# Altium footprint library 通讯接口.PcbLib: 24 footprints (part 2 of 2)
Each footprint in its own frame and in the unit in brackets; x right, y up, seen from the top. Pads: shape width x height; smd on the part's side, far side on the other; paste and mask are expansions set on the pad; w line width, h text height; cw(c..) or ccw(c..) is an arc to the next point about the centre after c.
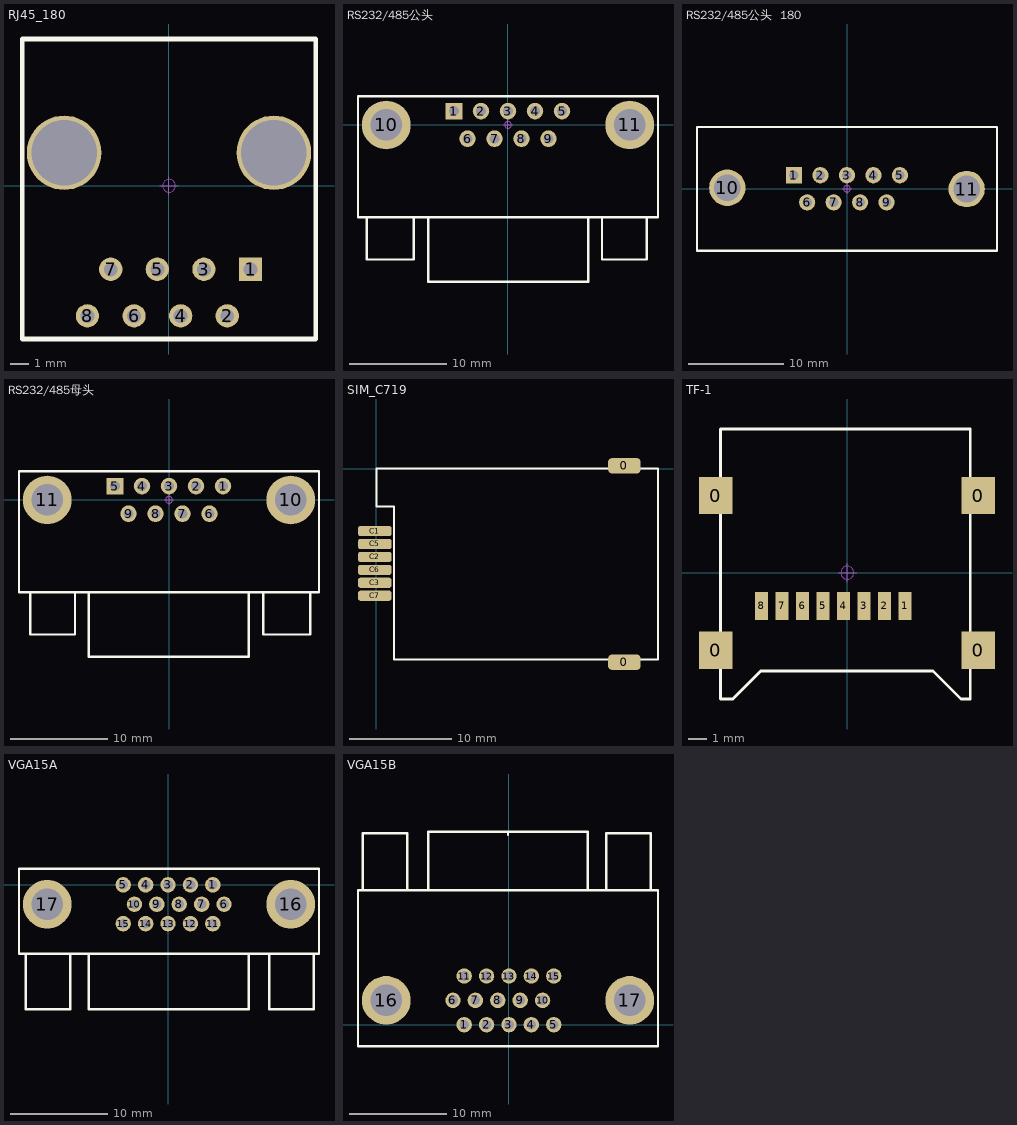
[diagram p1: the footprints below, top view; thin cyan lines are the x and y axes]

## RJ45_180 [mil] "网线接口"
height 53.15
pads (10):
  rect 50x50 hole 30: 1(175,-179.13)
  round 50 hole 30: 2(125,-279.13) 3(75,-179.13) 4(25,-279.13) 5(-25,-179.13) 6(-75,-279.13) 7(-125,-179.13) 8(-175,-279.13)
  round 160 hole 140: ""(-225,70.87) ""(225,70.87)
Top Overlay:
  lines w10: -314.96,-328.74 314.96,-328.74 314.96,314.96 -314.96,314.96 -314.96,-328.74
Mechanical 15:
  circle w1.97: c0,0 r13.78
  lines w1.97: -19.68,0 19.68,0 ; 0,-19.68 0,19.68
3D body "RJ-45, 8P8C, MOD JACK, TOP ENTRY, CAT 5E, RIA AJT26A8813.STEP": height 641.73, standoff -129.92, extent -305.11,-314.96 305.12,307.09

## RS232/485公头 [mm]
pads (11):
  rect 1.7x1.7 hole 1: 1(-5.546,1.42)
  round 1.7 hole 1: 2(-2.773,1.42) 3(0,1.42) 4(2.773,1.42) 5(5.546,1.42) 6(-4.155,-1.42) 7(-1.385,-1.42) 8(1.385,-1.42) 9(4.155,-1.42)
  round 5 hole 3.25: 10(-12.5,0) 11(12.5,0)
Top Overlay:
  lines w0.254: -14.478,-9.502 -14.478,-13.82 -9.652,-13.82 -9.652,-9.502 ; -8.175,-9.502 -8.175,-16.106 8.225,-16.106 8.225,-9.502 ; 9.652,-9.502 9.652,-13.82 14.224,-13.82 14.224,-9.502 ; -15.4,-9.502 15.4,-9.502 15.4,2.944 -15.4,2.944 -15.4,-9.502
Mechanical 15:
  circle w0.05: c0,0 r0.35
  lines w0.05: -0.5,0 0.5,0 ; 0,-0.5 0,0.5
3D body "DB9 ĸ_A.STEP": height 12.65, standoff -3.16, extent -15.45,-15.827 15.45,2.673

## RS232/485公头  180 [mm]
pads (11):
  rect 1.7x1.7 hole 1: 1(-5.556,1.42)
  round 1.7 hole 1: 2(-2.783,1.42) 3(-0.01,1.42) 4(2.763,1.42) 5(5.536,1.42) 6(-4.166,-1.42) 7(-1.396,-1.42) 8(1.374,-1.42) 9(4.144,-1.42)
  round 3.81 hole 2.794: 10(-12.522,0.104) 11(12.522,-0.023)
Top Overlay:
  lines w0.203: -15.697,-6.5 -15.697,6.454 15.697,6.454
  lines w0.254: -15.697,-6.5 15.697,-6.5 15.697,6.454
Mechanical 15:
  circle w0.05: c0,0 r0.35
  lines w0.05: -0.5,0 0.5,0 ; 0,-0.5 0,0.5
3D body "User Library-DB9-PCB Solder-male.STEP": height 12.17, standoff -4.73, extent -15.499,-6.2 15.499,6.2

## RS232/485母头 [mm]
pads (11):
  round 1.7 hole 1: 1(5.546,1.42) 2(2.773,1.42) 3(0,1.42) 4(-2.773,1.42) 6(4.155,-1.42) 7(1.385,-1.42) 8(-1.385,-1.42) 9(-4.155,-1.42)
  rect 1.7x1.7 hole 1: 5(-5.546,1.42)
  round 5 hole 3.25: 10(12.5,0) 11(-12.5,0)
Top Overlay:
  lines w0.254: -14.224,-9.502 -14.224,-13.82 -9.652,-13.82 -9.652,-9.502 ; -8.225,-9.502 -8.225,-16.106 8.175,-16.106 8.175,-9.502 ; 9.652,-9.502 9.652,-13.82 14.478,-13.82 14.478,-9.502 ; -15.4,-9.502 -15.4,2.944 15.4,2.944 15.4,-9.502 -15.4,-9.502
Mechanical 15:
  circle w0.05: c0,0 r0.35
  lines w0.05: -0.5,0 0.5,0 ; 0,-0.5 0,0.5
3D body "DB9 公_A.STEP": height 12.65, standoff -3.16, extent -15.45,-15.827 15.45,2.673

## SIM_C719 [mm]
pads (8):
  rrect50% 3.2x1.5 smd: 0(24.35,-18.995) 0(24.35,0.285)
  rrect50% 3.3x1 smd: C1(-0.15,-6.12) C2(-0.15,-8.66) C3(-0.15,-11.2) C5(-0.15,-7.39) C6(-0.15,-9.93) C7(-0.15,-12.47)
Top Overlay:
  lines w0.2: 0,-3.71 1.75,-3.71 1.75,-18.71 27.65,-18.71 27.65,0 0,0 0,-3.71
3D body: height 1.8, standoff 0, extent 0,-18.71 27.65,0

## TF-1 [mm]
height 2
pads (12):
  rect 1.8x2 smd: 0(-7.068,-4.16) 0(-7.068,4.14) 0(7.032,-4.16) 0(7.032,4.14)
  rect 0.7x1.5 smd: 1(3.1,-1.783) 2(2,-1.783) 3(0.9,-1.783) 4(-0.2,-1.783) 5(-1.3,-1.783) 6(-2.4,-1.783) 7(-3.5,-1.783) 8(-4.6,-1.783)
Top Overlay:
  lines w0.152: -6.8,-6.783 -6.8,7.717 3.1,7.717 6.6,7.717 6.6,-6.783 6.1,-6.783 4.6,-5.283 -4.65,-5.283 -6.15,-6.783 -6.8,-6.783
Mechanical 15:
  circle w0.05: c0,0 r0.35
  lines w0.05: -0.5,0 0.5,0 ; 0,-0.5 0,0.5
3D body "User Library-5009010801.STEP": height 1.93, standoff -0.02, extent -7.4,-6.783 7.2,7.717

## VGA15A [mm] "15针通讯接口"
pads (17):
  round 1.58 hole 1: 1(4.6,0) 2(2.3,0) 3(0,0) 4(-2.3,0) 5(-4.6,0) 6(5.75,-1.992) 7(3.45,-1.992) 8(1.15,-1.992) 9(-1.15,-1.992) 10(-3.45,-1.992) 11(4.6,-3.984) 12(2.3,-3.984) 13(0,-3.984) 14(-2.3,-3.984) 15(-4.6,-3.984)
  round 5 hole 3.25: 16(12.6,-1.992) 17(-12.4,-1.992)
Top Overlay:
  lines w0.254: -14.605,-7.087 -14.605,-12.751 -10.025,-12.751 -10.025,-7.087 ; -8.125,-7.061 -8.125,-12.751 8.275,-12.751 8.275,-7.137 ; 10.405,-7.061 10.405,-12.751 14.975,-12.751 14.975,-7.061 ; -15.3,-7.061 15.5,-7.061 15.5,1.629 -15.3,1.629 -15.3,-7.061
Mechanical 15:
  circle w0.05: c0,0 r0.35
  lines w0.05: -0.5,0 0.5,0 ; 0,-0.5 0,0.5
3D body "User Library-SLIM D-SUB RIGHT ANGLE PCB MOUNT.step": height 10.75, standoff -2.59, extent -15.397,-12.395 15.403,1.075

## VGA15B [mm] "15针通讯接口"
pads (17):
  round 1.58 hole 1: 1(-4.6,0) 2(-2.3,0) 3(0,0) 4(2.3,0) 5(4.6,0) 6(-5.75,2.5) 7(-3.45,2.5) 8(-1.15,2.5) 9(1.15,2.5) 10(3.45,2.5) 11(-4.6,5) 12(-2.3,5) 13(0,5) 14(2.3,5) 15(4.6,5)
  round 5 hole 3.25: 16(-12.6,2.5) 17(12.4,2.5)
Top Overlay:
  lines w0.254: -15.5,-2.2 -15.5,13.8 15.3,13.8 15.3,-2.2 -15.49,-2.2 -15.5,-2.19 ; -15,13.8 -15,19.67 -10.43,19.67 -10.43,13.82 ; -8.3,13.8 -8.3,19.8 8.1,19.8 8.1,13.8 ; -0.1,19.5 -0.1,19.8 ; 10,13.8 10,19.68 14.58,19.68 14.58,13.84
Mechanical 15:
  circle w0.05: c0,0 r0.35
  lines w0.05: -0.5,0 0.5,0 ; 0,-0.5 0,0.5
3D body "SW3dPS-Connector, D-Sub, 15 pin HD, RA, Receptacle.STEP": height 12.77, standoff -3.27, extent -15.655,-0.875 15.155,20.225